# Altium footprint library DipComponent.PcbLib: 303 footprints (part 8 of 19)
Each footprint in its own frame and in the unit in brackets; x right, y up, seen from the top. Pads: shape width x height; smd on the part's side, far side on the other; paste and mask are expansions set on the pad; w line width, h text height; cw(c..) or ccw(c..) is an arc to the next point about the centre after c.
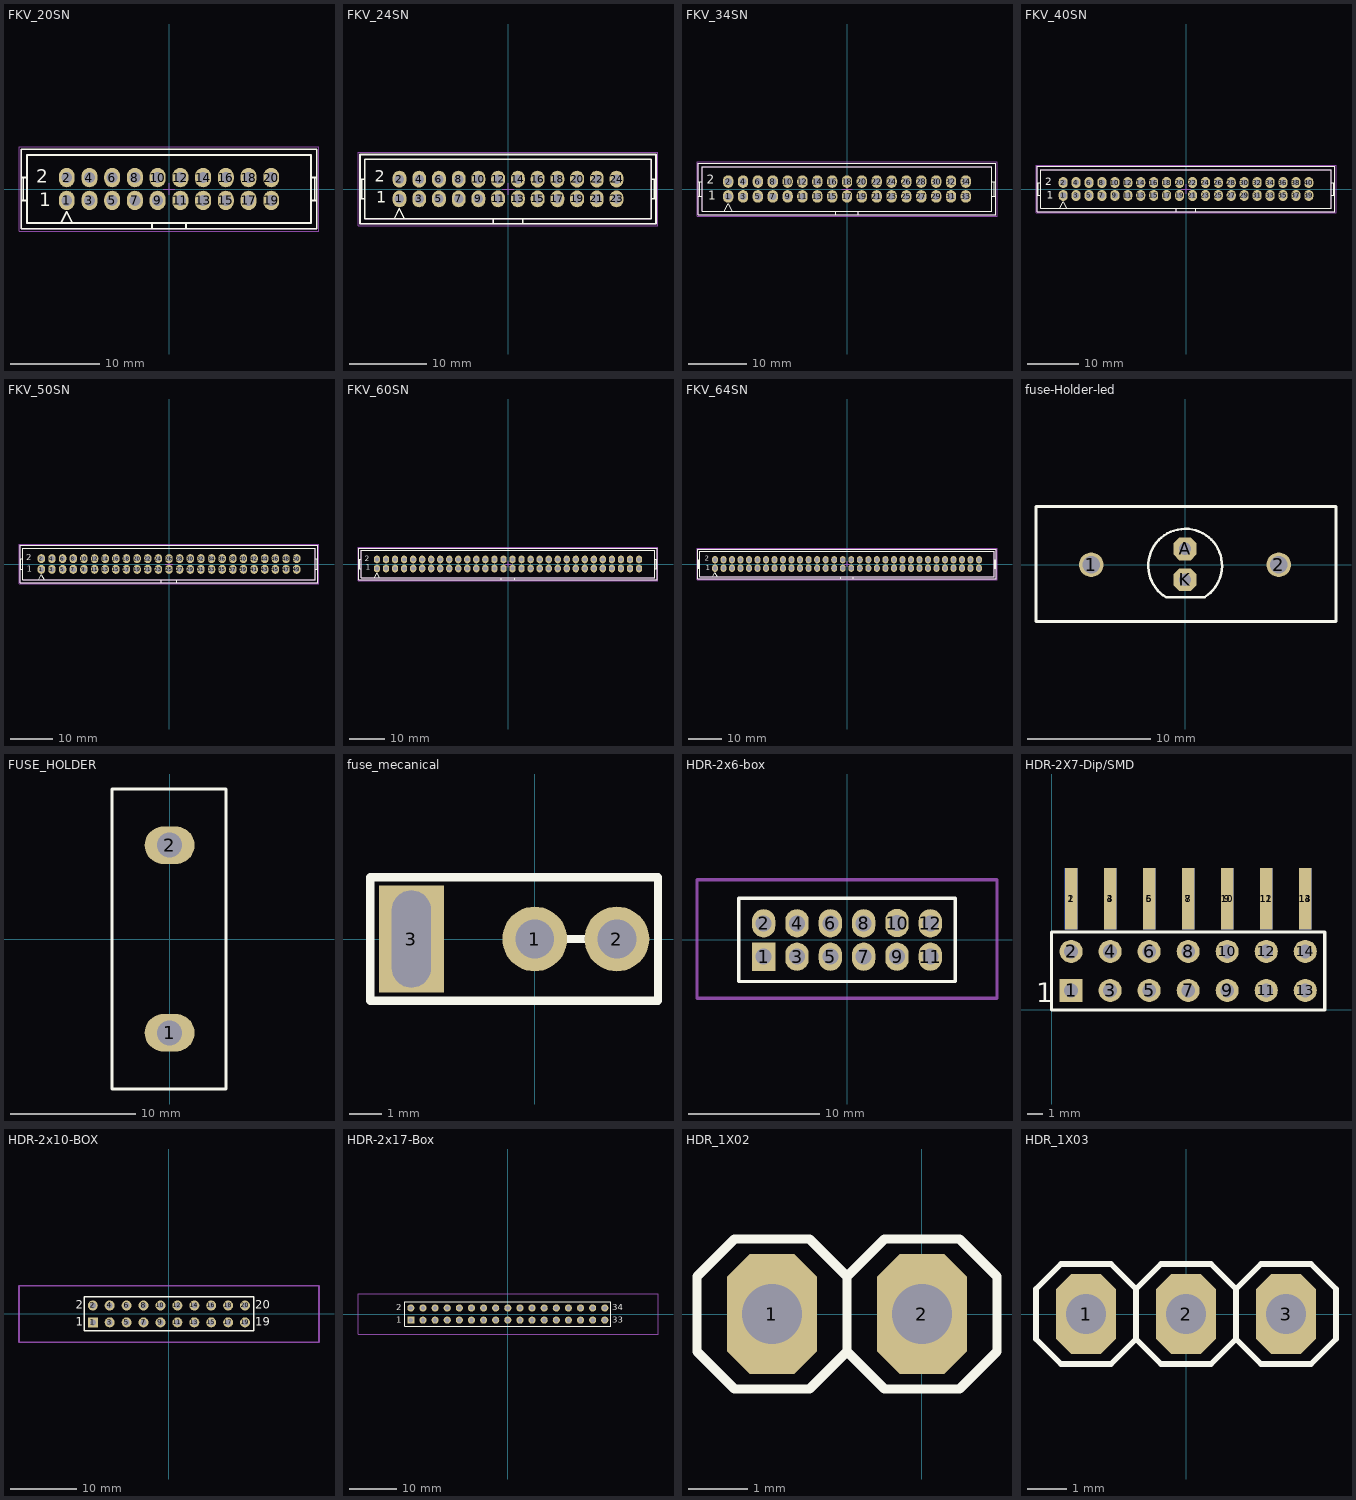
[diagram p7: the footprints below, top view; thin cyan lines are the x and y axes]

## FKV_20SN [mil] "Connector; BoxHeader; 10x2 Position ,2.54mm Pitch"
height 346.46
pads (20):
  oval 70x85 hole 48: 1(-450,-50) 2(-450,50) 3(-350,-50) 4(-350,50) 5(-250,-50) 6(-250,50) 7(-150,-50) 8(-150,50) 9(-50,-50) 10(-50,50) 11(50,-50) 12(50,50) 13(150,-50) 14(150,50) 15(250,-50) 16(250,50) 17(350,-50) 18(350,50) 19(450,-50) 20(450,50)
Top Overlay:
  lines w8: -650,-50 -625,-50 ; -650,50 -625,50 ; -641.67,-50 -641.67,50 ; -475,-150 -450,-100 -425,-150 ; -75,-175 -75,-150 ; 75,-175 75,-150 ; 625,-50 650,-50 ; 625,50 650,50 ; 641.67,-50 641.67,50 ; -75,-150 -625,-150 -625,150 625,150 625,-150 75,-150 ; -75,-150 75,-150 ; -650,-175 -650,175 650,175 650,-175 -650,-175
  text "2" at -585,27 h60
  text "1" at -572,-75 h60
Mechanical 13:
  drawing of 172 lines, arcs and shapes, not listed
Mechanical 15:
  lines w3.94: -25,0 0,0 ; 0,-25 0,0 ; 0,25 0,0 ; 25,0 0,0 ; -660,-185 660,-185 660,185 -660,185 -660,-185
3D body: height 314.96, standoff -129.92, extent 337.52,37.52 362.48,62.48
3D body: height 314.96, standoff -129.92, extent 437.52,37.52 462.48,62.48
3D body: height 314.96, standoff -129.92, extent 437.52,-62.48 462.48,-37.52
3D body: height 314.96, standoff -129.92, extent 337.52,-62.48 362.48,-37.52
3D body: height 314.96, standoff -129.92, extent 137.52,37.52 162.48,62.48
3D body: height 314.96, standoff -129.92, extent 237.52,37.52 262.48,62.48
3D body: height 314.96, standoff -129.92, extent 237.52,-62.48 262.48,-37.52
3D body: height 314.96, standoff -129.92, extent 137.52,-62.48 162.48,-37.52
3D body: height 314.96, standoff -129.92, extent -62.48,37.52 -37.52,62.48
3D body: height 314.96, standoff -129.92, extent 37.52,37.52 62.48,62.48
3D body: height 314.96, standoff -129.92, extent 37.52,-62.48 62.48,-37.52
3D body: height 314.96, standoff -129.92, extent -62.48,-62.48 -37.52,-37.52
3D body: height 314.96, standoff -129.92, extent -262.48,37.52 -237.52,62.48
3D body: height 314.96, standoff -129.92, extent -162.48,37.52 -137.52,62.48
3D body: height 314.96, standoff -129.92, extent -162.48,-62.48 -137.52,-37.52
3D body: height 314.96, standoff -129.92, extent -262.48,-62.48 -237.52,-37.52
3D body: height 314.96, standoff -129.92, extent -462.48,37.52 -437.52,62.48
3D body: height 314.96, standoff -129.92, extent -362.48,37.52 -337.52,62.48
3D body: height 314.96, standoff -129.92, extent -362.48,-62.48 -337.52,-37.52
3D body: height 314.96, standoff -129.92, extent -462.48,-62.48 -437.52,-37.52
3D body: height 346.46, standoff 0, extent -649.98,-174.98 649.98,174.98
3D body: height 78.74, standoff 0, extent -624.98,-149.98 624.98,149.98
3D body: height 118.11, standoff 0, extent -74.98,-174.98 74.98,-150.02

## FKV_24SN [mil] "Connector; BoxHeader; 12x2 Position ,2.54mm Pitch"
height 346.46
pads (24):
  oval 70x85 hole 48: 1(-550,-50) 2(-550,50) 3(-450,-50) 4(-450,50) 5(-350,-50) 6(-350,50) 7(-250,-50) 8(-250,50) 9(-150,-50) 10(-150,50) 11(-50,-50) 12(-50,50) 13(50,-50) 14(50,50) 15(150,-50) 16(150,50) 17(250,-50) 18(250,50) 19(350,-50) 20(350,50) 21(450,-50) 22(450,50) 23(550,-50) 24(550,50)
Top Overlay:
  lines w8: -750,-50 -725,-50 ; -750,50 -725,50 ; -741.67,-50 -741.67,50 ; -575,-150 -550,-100 -525,-150 ; -75,-175 -75,-150 ; 75,-175 75,-150 ; 725,-50 750,-50 ; 725,50 750,50 ; 741.67,-50 741.67,50 ; -75,-150 -725,-150 -725,150 725,150 725,-150 75,-150 ; -75,-150 75,-150 ; -750,-175 -750,175 750,175 750,-175 -750,-175
  text "2" at -674,36 h60
  text "1" at -668,-70 h60
Mechanical 13:
  drawing of 204 lines, arcs and shapes, not listed
Mechanical 15:
  lines w3.94: -30,0 0,0 ; 0,-30 0,0 ; 0,30 0,0 ; 30,0 0,0 ; -760,-185 760,-185 760,185 -760,185 -760,-185
3D body: height 346.46, standoff 0, extent -749.98,-174.98 749.98,174.98
3D body: height 78.74, standoff 0, extent -724.98,-149.98 724.98,149.98
3D body: height 118.11, standoff 0, extent -74.98,-174.98 74.98,-150.02
3D body: height 314.96, standoff -129.92, extent -562.48,-62.48 -537.52,-37.52
3D body: height 314.96, standoff -129.92, extent -462.48,-62.48 -437.52,-37.52
3D body: height 314.96, standoff -129.92, extent -462.48,37.52 -437.52,62.48
3D body: height 314.96, standoff -129.92, extent -562.48,37.52 -537.52,62.48
3D body: height 314.96, standoff -129.92, extent -362.48,-62.48 -337.52,-37.52
3D body: height 314.96, standoff -129.92, extent -262.48,-62.48 -237.52,-37.52
3D body: height 314.96, standoff -129.92, extent -262.48,37.52 -237.52,62.48
3D body: height 314.96, standoff -129.92, extent -362.48,37.52 -337.52,62.48
3D body: height 314.96, standoff -129.92, extent -162.48,-62.48 -137.52,-37.52
3D body: height 314.96, standoff -129.92, extent -62.48,-62.48 -37.52,-37.52
3D body: height 314.96, standoff -129.92, extent -62.48,37.52 -37.52,62.48
3D body: height 314.96, standoff -129.92, extent -162.48,37.52 -137.52,62.48
3D body: height 314.96, standoff -129.92, extent 37.52,-62.48 62.48,-37.52
3D body: height 314.96, standoff -129.92, extent 137.52,-62.48 162.48,-37.52
3D body: height 314.96, standoff -129.92, extent 137.52,37.52 162.48,62.48
3D body: height 314.96, standoff -129.92, extent 37.52,37.52 62.48,62.48
3D body: height 314.96, standoff -129.92, extent 237.52,-62.48 262.48,-37.52
3D body: height 314.96, standoff -129.92, extent 337.52,-62.48 362.48,-37.52
3D body: height 314.96, standoff -129.92, extent 337.52,37.52 362.48,62.48
3D body: height 314.96, standoff -129.92, extent 237.52,37.52 262.48,62.48
3D body: height 314.96, standoff -129.92, extent 437.52,-62.48 462.48,-37.52
3D body: height 314.96, standoff -129.92, extent 537.52,-62.48 562.48,-37.52
3D body: height 314.96, standoff -129.92, extent 537.52,37.52 562.48,62.48
3D body: height 314.96, standoff -129.92, extent 437.52,37.52 462.48,62.48

## FKV_34SN [mil] "Connector; BoxHeader; 17x2 Position ,2.54mm Pitch"
height 346.46
pads (34):
  oval 70x85 hole 48: 1(-800,-50) 2(-800,50) 3(-700,-50) 4(-700,50) 5(-600,-50) 6(-600,50) 7(-500,-50) 8(-500,50) 9(-400,-50) 10(-400,50) 11(-300,-50) 12(-300,50) 13(-200,-50) 14(-200,50) 15(-100,-50) 16(-100,50) 17(0,-50) 18(0,50) 19(100,-50) 20(100,50) 21(200,-50) 22(200,50) 23(300,-50) 24(300,50) 25(400,-50) 26(400,50) 27(500,-50) 28(500,50) 29(600,-50) 30(600,50) 31(700,-50) 32(700,50) 33(800,-50) 34(800,50)
Top Overlay:
  lines w8: -1000,-50 -975,-50 ; -1000,50 -975,50 ; -991.67,-50 -991.67,50 ; -825,-150 -800,-100 -775,-150 ; -75,-175 -75,-150 ; 75,-175 75,-150 ; 975,-50 1000,-50 ; 975,50 1000,50 ; 991.67,-50 991.67,50 ; -75,-150 75,-150 ; -75,-150 -975,-150 -975,150 975,150 975,-150 75,-150 ; -1000,-175 1000,-175 1000,175 -1000,175 -1000,-175
  text "1" at -934,-74 h60
  text "2" at -945,37 h60
Mechanical 13:
  drawing of 284 lines, arcs and shapes, not listed
Mechanical 15:
  lines w3.94: -35,0 0,0 ; 0,-35 0,0 ; 0,35 0,0 ; 35,0 0,0 ; -1010,-185 1010,-185 1010,185 -1010,185 -1010,-185
3D body: height 314.96, standoff -129.92, extent 787.52,37.52 812.48,62.48
3D body: height 314.96, standoff -129.92, extent 787.52,-62.48 812.48,-37.52
3D body: height 314.96, standoff -129.92, extent 587.52,37.52 612.48,62.48
3D body: height 314.96, standoff -129.92, extent 687.52,37.52 712.48,62.48
3D body: height 314.96, standoff -129.92, extent 687.52,-62.48 712.48,-37.52
3D body: height 314.96, standoff -129.92, extent 587.52,-62.48 612.48,-37.52
3D body: height 314.96, standoff -129.92, extent 387.52,37.52 412.48,62.48
3D body: height 314.96, standoff -129.92, extent 487.52,37.52 512.48,62.48
3D body: height 314.96, standoff -129.92, extent 487.52,-62.48 512.48,-37.52
3D body: height 314.96, standoff -129.92, extent 387.52,-62.48 412.48,-37.52
3D body: height 314.96, standoff -129.92, extent 187.52,37.52 212.48,62.48
3D body: height 314.96, standoff -129.92, extent 287.52,37.52 312.48,62.48
3D body: height 314.96, standoff -129.92, extent 287.52,-62.48 312.48,-37.52
3D body: height 314.96, standoff -129.92, extent 187.52,-62.48 212.48,-37.52
3D body: height 314.96, standoff -129.92, extent -12.48,37.52 12.48,62.48
3D body: height 314.96, standoff -129.92, extent 87.52,37.52 112.48,62.48
3D body: height 314.96, standoff -129.92, extent 87.52,-62.48 112.48,-37.52
3D body: height 314.96, standoff -129.92, extent -12.48,-62.48 12.48,-37.52
3D body: height 314.96, standoff -129.92, extent -212.48,37.52 -187.52,62.48
3D body: height 314.96, standoff -129.92, extent -112.48,37.52 -87.52,62.48
3D body: height 314.96, standoff -129.92, extent -112.48,-62.48 -87.52,-37.52
3D body: height 314.96, standoff -129.92, extent -212.48,-62.48 -187.52,-37.52
3D body: height 314.96, standoff -129.92, extent -412.48,37.52 -387.52,62.48
3D body: height 314.96, standoff -129.92, extent -312.48,37.52 -287.52,62.48
3D body: height 314.96, standoff -129.92, extent -312.48,-62.48 -287.52,-37.52
3D body: height 314.96, standoff -129.92, extent -412.48,-62.48 -387.52,-37.52
3D body: height 314.96, standoff -129.92, extent -612.48,37.52 -587.52,62.48
3D body: height 314.96, standoff -129.92, extent -512.48,37.52 -487.52,62.48
3D body: height 314.96, standoff -129.92, extent -512.48,-62.48 -487.52,-37.52
3D body: height 314.96, standoff -129.92, extent -612.48,-62.48 -587.52,-37.52
3D body: height 314.96, standoff -129.92, extent -812.48,37.52 -787.52,62.48
3D body: height 314.96, standoff -129.92, extent -712.48,37.52 -687.52,62.48
3D body: height 314.96, standoff -129.92, extent -712.48,-62.48 -687.52,-37.52
3D body: height 314.96, standoff -129.92, extent -812.48,-62.48 -787.52,-37.52
3D body: height 118.11, standoff 0, extent -74.98,-174.98 74.98,-150.02
3D body: height 78.74, standoff 0, extent -974.98,-149.98 974.98,149.98
3D body: height 346.46, standoff 0, extent -999.98,-174.98 999.98,174.98

## FKV_40SN [mil] "Connector; BoxHeader; 20x2 Position ,2.54mm Pitch"
height 346.46
pads (40):
  oval 70x85 hole 48: 1(-950,-50) 2(-950,50) 3(-850,-50) 4(-850,50) 5(-750,-50) 6(-750,50) 7(-650,-50) 8(-650,50) 9(-550,-50) 10(-550,50) 11(-450,-50) 12(-450,50) 13(-350,-50) 14(-350,50) 15(-250,-50) 16(-250,50) 17(-150,-50) 18(-150,50) 19(-50,-50) 20(-50,50) 21(50,-50) 22(50,50) 23(150,-50) 24(150,50) 25(250,-50) 26(250,50) 27(350,-50) 28(350,50) 29(450,-50) 30(450,50) 31(550,-50) 32(550,50) 33(650,-50) 34(650,50) 35(750,-50) 36(750,50) 37(850,-50) 38(850,50) 39(950,-50) 40(950,50)
Top Overlay:
  lines w8: -1150,-50 -1125,-50 ; -1150,50 -1125,50 ; -1141.67,-50 -1141.67,50 ; -975,-150 -950,-100 -925,-150 ; -75,-175 -75,-150 ; 75,-175 75,-150 ; 1125,-50 1150,-50 ; 1125,50 1150,50 ; 1141.67,-50 1141.67,50 ; -75,-150 -1125,-150 -1125,150 1125,150 1125,-150 75,-150 ; -75,-150 75,-150 ; -1150,-175 -1150,175 1150,175 1150,-175 -1150,-175
  text "1" at -1078,-75 h60
  text "2" at -1087,29 h60
Mechanical 13:
  drawing of 332 lines, arcs and shapes, not listed
Mechanical 15:
  lines w3.94: -35,0 0,0 ; 0,-35 0,0 ; 0,35 0,0 ; 35,0 0,0 ; -1160,-185 1160,-185 1160,185 -1160,185 -1160,-185
3D body: height 118.11, standoff 0, extent -74.98,-174.98 74.98,-150.02
3D body: height 78.74, standoff 0, extent -1124.98,-149.98 1124.98,149.98
3D body: height 346.46, standoff 0, extent -1149.98,-174.98 1149.98,174.98
3D body: height 314.96, standoff -129.92, extent -562.48,37.52 -537.52,62.48
3D body: height 314.96, standoff -129.92, extent -562.48,-62.48 -537.52,-37.52
3D body: height 314.96, standoff -129.92, extent -762.48,37.52 -737.52,62.48
3D body: height 314.96, standoff -129.92, extent -662.48,37.52 -637.52,62.48
3D body: height 314.96, standoff -129.92, extent -662.48,-62.48 -637.52,-37.52
3D body: height 314.96, standoff -129.92, extent -762.48,-62.48 -737.52,-37.52
3D body: height 314.96, standoff -129.92, extent -962.48,37.52 -937.52,62.48
3D body: height 314.96, standoff -129.92, extent -862.48,37.52 -837.52,62.48
3D body: height 314.96, standoff -129.92, extent -862.48,-62.48 -837.52,-37.52
3D body: height 314.96, standoff -129.92, extent -962.48,-62.48 -937.52,-37.52
3D body: height 314.96, standoff -129.92, extent -62.48,37.52 -37.52,62.48
3D body: height 314.96, standoff -129.92, extent -62.48,-62.48 -37.52,-37.52
3D body: height 314.96, standoff -129.92, extent -262.48,37.52 -237.52,62.48
3D body: height 314.96, standoff -129.92, extent -162.48,37.52 -137.52,62.48
3D body: height 314.96, standoff -129.92, extent -162.48,-62.48 -137.52,-37.52
3D body: height 314.96, standoff -129.92, extent -262.48,-62.48 -237.52,-37.52
3D body: height 314.96, standoff -129.92, extent -462.48,37.52 -437.52,62.48
3D body: height 314.96, standoff -129.92, extent -362.48,37.52 -337.52,62.48
3D body: height 314.96, standoff -129.92, extent -362.48,-62.48 -337.52,-37.52
3D body: height 314.96, standoff -129.92, extent -462.48,-62.48 -437.52,-37.52
3D body: height 314.96, standoff -129.92, extent 437.52,37.52 462.48,62.48
3D body: height 314.96, standoff -129.92, extent 437.52,-62.48 462.48,-37.52
3D body: height 314.96, standoff -129.92, extent 237.52,37.52 262.48,62.48
3D body: height 314.96, standoff -129.92, extent 337.52,37.52 362.48,62.48
3D body: height 314.96, standoff -129.92, extent 337.52,-62.48 362.48,-37.52
3D body: height 314.96, standoff -129.92, extent 237.52,-62.48 262.48,-37.52
3D body: height 314.96, standoff -129.92, extent 37.52,37.52 62.48,62.48
3D body: height 314.96, standoff -129.92, extent 137.52,37.52 162.48,62.48
3D body: height 314.96, standoff -129.92, extent 137.52,-62.48 162.48,-37.52
3D body: height 314.96, standoff -129.92, extent 37.52,-62.48 62.48,-37.52
3D body: height 314.96, standoff -129.92, extent 937.52,37.52 962.48,62.48
3D body: height 314.96, standoff -129.92, extent 937.52,-62.48 962.48,-37.52
3D body: height 314.96, standoff -129.92, extent 737.52,37.52 762.48,62.48
3D body: height 314.96, standoff -129.92, extent 837.52,37.52 862.48,62.48
3D body: height 314.96, standoff -129.92, extent 837.52,-62.48 862.48,-37.52
3D body: height 314.96, standoff -129.92, extent 737.52,-62.48 762.48,-37.52
3D body: height 314.96, standoff -129.92, extent 537.52,37.52 562.48,62.48
3D body: height 314.96, standoff -129.92, extent 637.52,37.52 662.48,62.48
3D body: height 314.96, standoff -129.92, extent 637.52,-62.48 662.48,-37.52
3D body: height 314.96, standoff -129.92, extent 537.52,-62.48 562.48,-37.52

## FKV_50SN [mil] "Connector; BoxHeader; 25x2 Position ,2.54mm Pitch"
height 346.46
pads (50):
  oval 70x85 hole 48: 1(-1200,-50) 2(-1200,50) 3(-1100,-50) 4(-1100,50) 5(-1000,-50) 6(-1000,50) 7(-900,-50) 8(-900,50) 9(-800,-50) 10(-800,50) 11(-700,-50) 12(-700,50) 13(-600,-50) 14(-600,50) 15(-500,-50) 16(-500,50) 17(-400,-50) 18(-400,50) 19(-300,-50) 20(-300,50) 21(-200,-50) 22(-200,50) 23(-100,-50) 24(-100,50) 25(0,-50) 26(0,50) 27(100,-50) 28(100,50) 29(200,-50) 30(200,50) 31(300,-50) 32(300,50) 33(400,-50) 34(400,50) 35(500,-50) 36(500,50) 37(600,-50) 38(600,50) 39(700,-50) 40(700,50) 41(800,-50) 42(800,50) 43(900,-50) 44(900,50) 45(1000,-50) 46(1000,50) 47(1100,-50) 48(1100,50) 49(1200,-50) 50(1200,50)
Top Overlay:
  lines w8: -1400,-50 -1375,-50 ; -1400,50 -1375,50 ; -1391.67,-50 -1391.67,50 ; -1225,-150 -1200,-100 -1175,-150 ; -75,-175 -75,-150 ; 75,-175 75,-150 ; 1375,-50 1400,-50 ; 1375,50 1400,50 ; 1391.67,-50 1391.67,50 ; -75,-150 -1375,-150 -1375,150 1375,150 1375,-150 75,-150 ; -75,-150 75,-150 ; -1400,-175 -1400,175 1400,175 1400,-175 -1400,-175
  text "1" at -1335,-71 h60
  text "2" at -1343,34 h60
Mechanical 13:
  drawing of 412 lines, arcs and shapes, not listed
Mechanical 15:
  lines w3.94: -35,0 0,0 ; 0,-35 0,0 ; 0,35 0,0 ; 35,0 0,0 ; -1410,-185 1410,-185 1410,185 -1410,185 -1410,-185
3D body: height 314.96, standoff -129.92, extent 1187.52,37.52 1212.48,62.48
3D body: height 314.96, standoff -129.92, extent 1187.52,-62.48 1212.48,-37.52
3D body: height 314.96, standoff -129.92, extent 987.52,37.52 1012.48,62.48
3D body: height 314.96, standoff -129.92, extent 1087.52,37.52 1112.48,62.48
3D body: height 314.96, standoff -129.92, extent 1087.52,-62.48 1112.48,-37.52
3D body: height 314.96, standoff -129.92, extent 987.52,-62.48 1012.48,-37.52
3D body: height 314.96, standoff -129.92, extent 787.52,37.52 812.48,62.48
3D body: height 314.96, standoff -129.92, extent 887.52,37.52 912.48,62.48
3D body: height 314.96, standoff -129.92, extent 887.52,-62.48 912.48,-37.52
3D body: height 314.96, standoff -129.92, extent 787.52,-62.48 812.48,-37.52
3D body: height 314.96, standoff -129.92, extent 687.52,37.52 712.48,62.48
3D body: height 314.96, standoff -129.92, extent 687.52,-62.48 712.48,-37.52
3D body: height 314.96, standoff -129.92, extent 487.52,37.52 512.48,62.48
3D body: height 314.96, standoff -129.92, extent 587.52,37.52 612.48,62.48
3D body: height 314.96, standoff -129.92, extent 587.52,-62.48 612.48,-37.52
3D body: height 314.96, standoff -129.92, extent 487.52,-62.48 512.48,-37.52
3D body: height 314.96, standoff -129.92, extent 287.52,37.52 312.48,62.48
3D body: height 314.96, standoff -129.92, extent 387.52,37.52 412.48,62.48
3D body: height 314.96, standoff -129.92, extent 387.52,-62.48 412.48,-37.52
3D body: height 314.96, standoff -129.92, extent 287.52,-62.48 312.48,-37.52
3D body: height 314.96, standoff -129.92, extent 187.52,37.52 212.48,62.48
3D body: height 314.96, standoff -129.92, extent 187.52,-62.48 212.48,-37.52
3D body: height 314.96, standoff -129.92, extent -12.48,37.52 12.48,62.48
3D body: height 314.96, standoff -129.92, extent 87.52,37.52 112.48,62.48
3D body: height 314.96, standoff -129.92, extent 87.52,-62.48 112.48,-37.52
3D body: height 314.96, standoff -129.92, extent -12.48,-62.48 12.48,-37.52
3D body: height 314.96, standoff -129.92, extent -212.48,37.52 -187.52,62.48
3D body: height 314.96, standoff -129.92, extent -112.48,37.52 -87.52,62.48
3D body: height 314.96, standoff -129.92, extent -112.48,-62.48 -87.52,-37.52
3D body: height 314.96, standoff -129.92, extent -212.48,-62.48 -187.52,-37.52
3D body: height 314.96, standoff -129.92, extent -312.48,37.52 -287.52,62.48
3D body: height 314.96, standoff -129.92, extent -312.48,-62.48 -287.52,-37.52
3D body: height 314.96, standoff -129.92, extent -512.48,37.52 -487.52,62.48
3D body: height 314.96, standoff -129.92, extent -412.48,37.52 -387.52,62.48
3D body: height 314.96, standoff -129.92, extent -412.48,-62.48 -387.52,-37.52
3D body: height 314.96, standoff -129.92, extent -512.48,-62.48 -487.52,-37.52
3D body: height 314.96, standoff -129.92, extent -712.48,37.52 -687.52,62.48
3D body: height 314.96, standoff -129.92, extent -612.48,37.52 -587.52,62.48
3D body: height 314.96, standoff -129.92, extent -612.48,-62.48 -587.52,-37.52
3D body: height 314.96, standoff -129.92, extent -712.48,-62.48 -687.52,-37.52
3D body: height 314.96, standoff -129.92, extent -812.48,37.52 -787.52,62.48
3D body: height 314.96, standoff -129.92, extent -812.48,-62.48 -787.52,-37.52
3D body: height 314.96, standoff -129.92, extent -1012.48,37.52 -987.52,62.48
3D body: height 314.96, standoff -129.92, extent -912.48,37.52 -887.52,62.48
3D body: height 314.96, standoff -129.92, extent -912.48,-62.48 -887.52,-37.52
3D body: height 314.96, standoff -129.92, extent -1012.48,-62.48 -987.52,-37.52
3D body: height 314.96, standoff -129.92, extent -1212.48,37.52 -1187.52,62.48
3D body: height 314.96, standoff -129.92, extent -1112.48,37.52 -1087.52,62.48
3D body: height 314.96, standoff -129.92, extent -1112.48,-62.48 -1087.52,-37.52
3D body: height 314.96, standoff -129.92, extent -1212.48,-62.48 -1187.52,-37.52
3D body: height 346.46, standoff 0, extent -1399.98,-174.98 1399.98,174.98
3D body: height 78.74, standoff 0, extent -1374.98,-149.98 1374.98,149.98
3D body: height 118.11, standoff 0, extent -74.98,-174.98 74.98,-150.02

## FKV_60SN [mil] "Connector; BoxHeader; 30x2 Position ,2.54mm Pitch"
height 346.46
pads (60):
  oval 70x85 hole 48: 1(-1450,-50) 2(-1450,50) 3(-1350,-50) 4(-1350,50) 5(-1250,-50) 6(-1250,50) 7(-1150,-50) 8(-1150,50) 9(-1050,-50) 10(-1050,50) 11(-950,-50) 12(-950,50) 13(-850,-50) 14(-850,50) 15(-750,-50) 16(-750,50) 17(-650,-50) 18(-650,50) 19(-550,-50) 20(-550,50) 21(-450,-50) 22(-450,50) 23(-350,-50) 24(-350,50) 25(-250,-50) 26(-250,50) 27(-150,-50) 28(-150,50) 29(-50,-50) 30(-50,50) 31(50,-50) 32(50,50) 33(150,-50) 34(150,50) 35(250,-50) 36(250,50) 37(350,-50) 38(350,50) 39(450,-50) 40(450,50) 41(550,-50) 42(550,50) 43(650,-50) 44(650,50) 45(750,-50) 46(750,50) 47(850,-50) 48(850,50) 49(950,-50) 50(950,50) 51(1050,-50) 52(1050,50) 53(1150,-50) 54(1150,50) 55(1250,-50) 56(1250,50) 57(1350,-50) 58(1350,50) 59(1450,-50) 60(1450,50)
Top Overlay:
  lines w8: -1650,-50 -1625,-50 ; -1650,50 -1625,50 ; -1641.67,-50 -1641.67,50 ; -1475,-150 -1450,-100 -1425,-150 ; -75,-175 -75,-150 ; 75,-175 75,-150 ; 1625,-50 1650,-50 ; 1625,50 1650,50 ; 1641.67,-50 1641.67,50 ; -75,-150 75,-150 ; -75,-150 -1625,-150 -1625,150 1625,150 1625,-150 75,-150 ; -1650,-175 1650,-175 1650,175 -1650,175 -1650,-175
  text "1" at -1576,-66 h60
  text "2" at -1585,32 h60
Mechanical 13:
  drawing of 492 lines, arcs and shapes, not listed
Mechanical 15:
  lines w3.94: -35,0 0,0 ; 0,-35 0,0 ; 0,35 0,0 ; 35,0 0,0 ; -1660,-185 -1660,185 1660,185 1660,-185 -1660,-185
3D body: height 314.96, standoff -129.92, extent 1037.52,-62.48 1062.48,-37.52
3D body: height 314.96, standoff -129.92, extent 1137.52,-62.48 1162.48,-37.52
3D body: height 314.96, standoff -129.92, extent 1137.52,37.52 1162.48,62.48
3D body: height 314.96, standoff -129.92, extent 1037.52,37.52 1062.48,62.48
3D body: height 314.96, standoff -129.92, extent 1237.52,-62.48 1262.48,-37.52
3D body: height 314.96, standoff -129.92, extent 1337.52,-62.48 1362.48,-37.52
3D body: height 314.96, standoff -129.92, extent 1337.52,37.52 1362.48,62.48
3D body: height 314.96, standoff -129.92, extent 1237.52,37.52 1262.48,62.48
3D body: height 314.96, standoff -129.92, extent 1437.52,-62.48 1462.48,-37.52
3D body: height 314.96, standoff -129.92, extent 1437.52,37.52 1462.48,62.48
3D body: height 314.96, standoff -129.92, extent 537.52,-62.48 562.48,-37.52
3D body: height 314.96, standoff -129.92, extent 637.52,-62.48 662.48,-37.52
3D body: height 314.96, standoff -129.92, extent 637.52,37.52 662.48,62.48
3D body: height 314.96, standoff -129.92, extent 537.52,37.52 562.48,62.48
3D body: height 314.96, standoff -129.92, extent 737.52,-62.48 762.48,-37.52
3D body: height 314.96, standoff -129.92, extent 837.52,-62.48 862.48,-37.52
3D body: height 314.96, standoff -129.92, extent 837.52,37.52 862.48,62.48
3D body: height 314.96, standoff -129.92, extent 737.52,37.52 762.48,62.48
3D body: height 314.96, standoff -129.92, extent 937.52,-62.48 962.48,-37.52
3D body: height 314.96, standoff -129.92, extent 937.52,37.52 962.48,62.48
3D body: height 314.96, standoff -129.92, extent 37.52,-62.48 62.48,-37.52
3D body: height 314.96, standoff -129.92, extent 137.52,-62.48 162.48,-37.52
3D body: height 314.96, standoff -129.92, extent 137.52,37.52 162.48,62.48
3D body: height 314.96, standoff -129.92, extent 37.52,37.52 62.48,62.48
3D body: height 314.96, standoff -129.92, extent 237.52,-62.48 262.48,-37.52
3D body: height 314.96, standoff -129.92, extent 337.52,-62.48 362.48,-37.52
3D body: height 314.96, standoff -129.92, extent 337.52,37.52 362.48,62.48
3D body: height 314.96, standoff -129.92, extent 237.52,37.52 262.48,62.48
3D body: height 314.96, standoff -129.92, extent 437.52,-62.48 462.48,-37.52
3D body: height 314.96, standoff -129.92, extent 437.52,37.52 462.48,62.48
3D body: height 314.96, standoff -129.92, extent -462.48,-62.48 -437.52,-37.52
3D body: height 314.96, standoff -129.92, extent -362.48,-62.48 -337.52,-37.52
3D body: height 314.96, standoff -129.92, extent -362.48,37.52 -337.52,62.48
3D body: height 314.96, standoff -129.92, extent -462.48,37.52 -437.52,62.48
3D body: height 314.96, standoff -129.92, extent -262.48,-62.48 -237.52,-37.52
3D body: height 314.96, standoff -129.92, extent -162.48,-62.48 -137.52,-37.52
3D body: height 314.96, standoff -129.92, extent -162.48,37.52 -137.52,62.48
3D body: height 314.96, standoff -129.92, extent -262.48,37.52 -237.52,62.48
3D body: height 314.96, standoff -129.92, extent -62.48,-62.48 -37.52,-37.52
3D body: height 314.96, standoff -129.92, extent -62.48,37.52 -37.52,62.48
3D body: height 314.96, standoff -129.92, extent -962.48,-62.48 -937.52,-37.52
3D body: height 314.96, standoff -129.92, extent -862.48,-62.48 -837.52,-37.52
3D body: height 314.96, standoff -129.92, extent -862.48,37.52 -837.52,62.48
3D body: height 314.96, standoff -129.92, extent -962.48,37.52 -937.52,62.48
3D body: height 314.96, standoff -129.92, extent -762.48,-62.48 -737.52,-37.52
3D body: height 314.96, standoff -129.92, extent -662.48,-62.48 -637.52,-37.52
3D body: height 314.96, standoff -129.92, extent -662.48,37.52 -637.52,62.48
3D body: height 314.96, standoff -129.92, extent -762.48,37.52 -737.52,62.48
3D body: height 314.96, standoff -129.92, extent -562.48,-62.48 -537.52,-37.52
3D body: height 314.96, standoff -129.92, extent -562.48,37.52 -537.52,62.48
3D body: height 314.96, standoff -129.92, extent -1462.48,-62.48 -1437.52,-37.52
3D body: height 314.96, standoff -129.92, extent -1362.48,-62.48 -1337.52,-37.52
3D body: height 314.96, standoff -129.92, extent -1362.48,37.52 -1337.52,62.48
3D body: height 314.96, standoff -129.92, extent -1462.48,37.52 -1437.52,62.48
3D body: height 314.96, standoff -129.92, extent -1262.48,-62.48 -1237.52,-37.52
3D body: height 314.96, standoff -129.92, extent -1162.48,-62.48 -1137.52,-37.52
3D body: height 314.96, standoff -129.92, extent -1162.48,37.52 -1137.52,62.48
3D body: height 314.96, standoff -129.92, extent -1262.48,37.52 -1237.52,62.48
3D body: height 314.96, standoff -129.92, extent -1062.48,-62.48 -1037.52,-37.52
3D body: height 314.96, standoff -129.92, extent -1062.48,37.52 -1037.52,62.48
3D body: height 346.46, standoff 0, extent -1649.98,-174.98 1649.98,174.98
3D body: height 78.74, standoff 0, extent -1624.98,-149.98 1624.98,149.98
3D body: height 118.11, standoff 0, extent -74.98,-174.98 74.98,-150.02

## FKV_64SN [mil] "Connector; BoxHeader; 32x2 Position ,2.54mm Pitch"
height 346.46
pads (64):
  oval 70x85 hole 48: 1(-1550,-50) 2(-1550,50) 3(-1450,-50) 4(-1450,50) 5(-1350,-50) 6(-1350,50) 7(-1250,-50) 8(-1250,50) 9(-1150,-50) 10(-1150,50) 11(-1050,-50) 12(-1050,50) 13(-950,-50) 14(-950,50) 15(-850,-50) 16(-850,50) 17(-750,-50) 18(-750,50) 19(-650,-50) 20(-650,50) 21(-550,-50) 22(-550,50) 23(-450,-50) 24(-450,50) 25(-350,-50) 26(-350,50) 27(-250,-50) 28(-250,50) 29(-150,-50) 30(-150,50) 31(-50,-50) 32(-50,50) 33(50,-50) 34(50,50) 35(150,-50) 36(150,50) 37(250,-50) 38(250,50) 39(350,-50) 40(350,50) 41(450,-50) 42(450,50) 43(550,-50) 44(550,50) 45(650,-50) 46(650,50) 47(750,-50) 48(750,50) 49(850,-50) 50(850,50) 51(950,-50) 52(950,50) 53(1050,-50) 54(1050,50) 55(1150,-50) 56(1150,50) 57(1250,-50) 58(1250,50) 59(1350,-50) 60(1350,50) 61(1450,-50) 62(1450,50) 63(1550,-50) 64(1550,50)
Top Overlay:
  lines w8: -1750,-50 -1725,-50 ; -1750,50 -1725,50 ; -1741.67,-50 -1741.67,50 ; -1575,-150 -1550,-100 -1525,-150 ; -75,-175 -75,-150 ; 75,-175 75,-150 ; 1725,-50 1750,-50 ; 1725,50 1750,50 ; 1741.67,-50 1741.67,50 ; -75,-150 -1725,-150 -1725,150 1725,150 1725,-150 75,-150 ; -75,-150 75,-150 ; -1750,-175 -1750,175 1750,175 1750,-175 -1750,-175
  text "2" at -1669,41 h60
  text "1" at -1660,-76 h60
Mechanical 13:
  drawing of 524 lines, arcs and shapes, not listed
Mechanical 15:
  lines w3.94: -30,0 0,0 ; 0,-30 0,0 ; 0,30 0,0 ; 30,0 0,0 ; -1760,-185 1760,-185 1760,185 -1760,185 -1760,-185
3D body: height 118.11, standoff 0, extent -74.98,-174.98 74.98,-150.02
3D body: height 78.74, standoff 0, extent -1724.98,-149.98 1724.98,149.98
3D body: height 346.46, standoff 0, extent -1749.98,-174.98 1749.98,174.98
3D body: height 314.96, standoff -129.92, extent -1562.48,-62.48 -1537.52,-37.52
3D body: height 314.96, standoff -129.92, extent -1462.48,-62.48 -1437.52,-37.52
3D body: height 314.96, standoff -129.92, extent -1462.48,37.52 -1437.52,62.48
3D body: height 314.96, standoff -129.92, extent -1562.48,37.52 -1537.52,62.48
3D body: height 314.96, standoff -129.92, extent -1362.48,-62.48 -1337.52,-37.52
3D body: height 314.96, standoff -129.92, extent -1262.48,-62.48 -1237.52,-37.52
3D body: height 314.96, standoff -129.92, extent -1262.48,37.52 -1237.52,62.48
3D body: height 314.96, standoff -129.92, extent -1362.48,37.52 -1337.52,62.48
3D body: height 314.96, standoff -129.92, extent -1162.48,-62.48 -1137.52,-37.52
3D body: height 314.96, standoff -129.92, extent -1062.48,-62.48 -1037.52,-37.52
3D body: height 314.96, standoff -129.92, extent -1062.48,37.52 -1037.52,62.48
3D body: height 314.96, standoff -129.92, extent -1162.48,37.52 -1137.52,62.48
3D body: height 314.96, standoff -129.92, extent -962.48,-62.48 -937.52,-37.52
3D body: height 314.96, standoff -129.92, extent -862.48,-62.48 -837.52,-37.52
3D body: height 314.96, standoff -129.92, extent -862.48,37.52 -837.52,62.48
3D body: height 314.96, standoff -129.92, extent -962.48,37.52 -937.52,62.48
3D body: height 314.96, standoff -129.92, extent -762.48,-62.48 -737.52,-37.52
3D body: height 314.96, standoff -129.92, extent -662.48,-62.48 -637.52,-37.52
3D body: height 314.96, standoff -129.92, extent -662.48,37.52 -637.52,62.48
3D body: height 314.96, standoff -129.92, extent -762.48,37.52 -737.52,62.48
3D body: height 314.96, standoff -129.92, extent -562.48,-62.48 -537.52,-37.52
3D body: height 314.96, standoff -129.92, extent -462.48,-62.48 -437.52,-37.52
3D body: height 314.96, standoff -129.92, extent -462.48,37.52 -437.52,62.48
3D body: height 314.96, standoff -129.92, extent -562.48,37.52 -537.52,62.48
3D body: height 314.96, standoff -129.92, extent -362.48,-62.48 -337.52,-37.52
3D body: height 314.96, standoff -129.92, extent -262.48,-62.48 -237.52,-37.52
3D body: height 314.96, standoff -129.92, extent -262.48,37.52 -237.52,62.48
3D body: height 314.96, standoff -129.92, extent -362.48,37.52 -337.52,62.48
3D body: height 314.96, standoff -129.92, extent -162.48,-62.48 -137.52,-37.52
3D body: height 314.96, standoff -129.92, extent -62.48,-62.48 -37.52,-37.52
3D body: height 314.96, standoff -129.92, extent -62.48,37.52 -37.52,62.48
3D body: height 314.96, standoff -129.92, extent -162.48,37.52 -137.52,62.48
3D body: height 314.96, standoff -129.92, extent 37.52,-62.48 62.48,-37.52
3D body: height 314.96, standoff -129.92, extent 137.52,-62.48 162.48,-37.52
3D body: height 314.96, standoff -129.92, extent 137.52,37.52 162.48,62.48
3D body: height 314.96, standoff -129.92, extent 37.52,37.52 62.48,62.48
3D body: height 314.96, standoff -129.92, extent 237.52,-62.48 262.48,-37.52
3D body: height 314.96, standoff -129.92, extent 337.52,-62.48 362.48,-37.52
3D body: height 314.96, standoff -129.92, extent 337.52,37.52 362.48,62.48
3D body: height 314.96, standoff -129.92, extent 237.52,37.52 262.48,62.48
3D body: height 314.96, standoff -129.92, extent 437.52,-62.48 462.48,-37.52
3D body: height 314.96, standoff -129.92, extent 537.52,-62.48 562.48,-37.52
3D body: height 314.96, standoff -129.92, extent 537.52,37.52 562.48,62.48
3D body: height 314.96, standoff -129.92, extent 437.52,37.52 462.48,62.48
3D body: height 314.96, standoff -129.92, extent 637.52,-62.48 662.48,-37.52
3D body: height 314.96, standoff -129.92, extent 737.52,-62.48 762.48,-37.52
3D body: height 314.96, standoff -129.92, extent 737.52,37.52 762.48,62.48
3D body: height 314.96, standoff -129.92, extent 637.52,37.52 662.48,62.48
3D body: height 314.96, standoff -129.92, extent 837.52,-62.48 862.48,-37.52
3D body: height 314.96, standoff -129.92, extent 937.52,-62.48 962.48,-37.52
3D body: height 314.96, standoff -129.92, extent 937.52,37.52 962.48,62.48
3D body: height 314.96, standoff -129.92, extent 837.52,37.52 862.48,62.48
3D body: height 314.96, standoff -129.92, extent 1037.52,-62.48 1062.48,-37.52
3D body: height 314.96, standoff -129.92, extent 1137.52,-62.48 1162.48,-37.52
3D body: height 314.96, standoff -129.92, extent 1137.52,37.52 1162.48,62.48
3D body: height 314.96, standoff -129.92, extent 1037.52,37.52 1062.48,62.48
3D body: height 314.96, standoff -129.92, extent 1237.52,-62.48 1262.48,-37.52
3D body: height 314.96, standoff -129.92, extent 1337.52,-62.48 1362.48,-37.52
3D body: height 314.96, standoff -129.92, extent 1337.52,37.52 1362.48,62.48
3D body: height 314.96, standoff -129.92, extent 1237.52,37.52 1262.48,62.48
3D body: height 314.96, standoff -129.92, extent 1437.52,-62.48 1462.48,-37.52
3D body: height 314.96, standoff -129.92, extent 1537.52,-62.48 1562.48,-37.52
3D body: height 314.96, standoff -129.92, extent 1537.52,37.52 1562.48,62.48
3D body: height 314.96, standoff -129.92, extent 1437.52,37.52 1462.48,62.48

## fuse-Holder-led [mm] "with led"
pads (4):
  round 2 hole 1.4: 1(-7.62,0) 2(7.62,0)
  oct 1.85x1.85 hole 1: A(0,1.292) K(0,-1.208)
Top Overlay:
  lines w0.2: -1.543,-2.639 1.599,-2.621 ccw(c0.01,-0.077) -1.535,-2.648
  lines w0.254: -12.116,-4.623 12.268,-4.623 12.268,4.75 -12.116,4.75 -12.116,-4.623
3D body "Fuse-Holder.stp": height 14, standoff -3, extent -12.098,-4.648 12.302,4.752

## FUSE_HOLDER [mm]
pads (2):
  oval 4x3 hole 2: 1(0,-7.5) 2(0,7.5)
Top Overlay:
  lines w0.254: -4.6,-12 -4.6,12 4.5,12 4.5,-12 -4.6,-12
3D body "SW3dPS-part 8.STEP": height 12.96, standoff -2.9, extent -4.606,-12.031 4.476,11.969

## fuse_mecanical [mm]
pads (3):
  round 2 hole 1.2: 1(0,0) 2(2.54,0)
  rect 2x3.3 hole 1.2 slot 3 at 90 deg: 3(-3.81,0)
Top Overlay:
  lines w0.254: 0,0 2.54,0 ; -5.08,-1.905 3.81,-1.905 3.81,1.905 -5.08,1.905 -5.08,-1.905
3D body "1W right 100mil.step": height 14.83, standoff -2.23, extent -1.736,-1.905 3.006,1.895

## HDR-2x6-box [mil]
pads (12):
  rect 70x85 hole 48: 1(-250,-50.5)
  oval 70x85 hole 48: 2(-250,49.5) 3(-150,-50.5) 4(-150,49.5) 5(-50,-50.5) 6(-50,49.5) 7(50,-50.5) 8(50,49.5) 9(150,-50.5) 10(150,50.5) 11(250,-50.5) 12(250,49.5)
Top Overlay:
  lines w10: -325,-125 -325,125 325,125 325,-125 -325,-125
Mechanical 13:
  lines w3.94: -270,-70.5 -270,-30.5 -230,-30.5 -230,-70.5 -270,-70.5 ; -270,29.5 -230,29.5 -230,69.5 -270,69.5 -270,29.5 ; -170,-70.5 -130,-70.5 -130,-30.5 -170,-30.5 -170,-70.5 ; -170,29.5 -130,29.5 -130,69.5 -170,69.5 -170,29.5 ; -70,-70.5 -70,-30.5 -30,-30.5 -30,-70.5 -70,-70.5 ; -70,29.5 -30,29.5 -30,69.5 -70,69.5 -70,29.5 ; 30,-70.5 70,-70.5 70,-30.5 30,-30.5 30,-70.5 ; 30,29.5 70,29.5 70,69.5 30,69.5 30,29.5 ; 130,-70.5 130,-30.5 170,-30.5 170,-70.5 130,-70.5 ; 130,29.5 170,29.5 170,69.5 130,69.5 130,29.5 ; 230,-70.5 270,-70.5 270,-30.5 230,-30.5 230,-70.5 ; 230,29.5 270,29.5 270,69.5 230,69.5 230,29.5
Mechanical 15:
  lines w10: -450,-175 450,-175 450,180 -450,180 -450,-175
3D body "HeaderBox12.STEP": height 358.27, standoff -118.11, extent -448,-175.77 452,182.5

## HDR-2X7-Dip/SMD [mm] "Connector; Header; 7x2 Position"
pads (28):
  rect 1.5x1.5 hole 0.9: 1(1.27,1.257)
  rect 0.8x4 smd: 1(1.27,7.226) 3(3.81,7.226) 5(6.35,7.226) 7(8.89,7.226) 9(11.43,7.226) 11(13.97,7.226) 13(16.51,7.226)
  round 1.5 hole 0.9: 2(1.27,3.797) 3(3.81,1.257) 4(3.81,3.797) 5(6.35,1.257) 6(6.35,3.797) 7(8.89,1.257) 8(8.89,3.797) 9(11.43,1.257) 10(11.43,3.797) 11(13.97,1.257) 12(13.97,3.797) 13(16.51,1.257) 14(16.51,3.797)
  rect 0.8x4 smd far side: 2(1.27,7.226) 4(3.81,7.226) 6(6.35,7.226) 8(8.89,7.226) 10(11.43,7.226) 12(13.97,7.226) 14(16.51,7.226)
Top Overlay:
  lines w0.2: 0,-0.013 0,5.067 17.78,5.067 17.78,-0.013 0,-0.013
  text "1" at -1.016,0.495 h1.27

## HDR-2x10-BOX [mm]
pads (20):
  rect 1.5x1.5 hole 0.9: 1(-11.43,-1.27)
  round 1.5 hole 0.9: 2(-11.43,1.27) 3(-8.89,-1.27) 4(-8.89,1.27) 5(-6.35,-1.27) 6(-6.35,1.27) 7(-3.81,-1.27) 8(-3.81,1.27) 9(-1.27,-1.27) 10(-1.27,1.27) 11(1.27,-1.27) 12(1.27,1.27) 13(3.81,-1.27) 14(3.81,1.27) 15(6.35,-1.27) 16(6.35,1.27) 17(8.89,-1.27) 18(8.89,1.27) 19(11.43,-1.27) 20(11.43,1.27)
Top Overlay:
  lines w0.2: -12.7,-2.54 -10.795,-2.54 12.7,-2.54 12.7,2.54 -10.795,2.54 -12.7,2.54 -12.7,-2.54
  text "20" at 12.954,0.762 h1.27
  text "19" at 12.954,-1.778 h1.27
  text "1" at -13.97,-1.778 h1.27
  text "2" at -13.97,0.762 h1.27
Mechanical 15:
  lines w0.254: -22.504,-4.267 22.53,-4.267 22.53,4.242 -22.504,4.242 -22.504,-4.267
3D body "IDC2x17.stp": height 23.39, standoff -3.11, extent -22.494,-4.267 22.506,4.233

## HDR-2x17-Box [mm]
pads (34):
  rect 1.5x1.5 hole 0.9: 1(-20.32,-1.27)
  round 1.5 hole 0.9: 2(-20.32,1.27) 3(-17.78,-1.27) 4(-17.78,1.27) 5(-15.24,-1.27) 6(-15.24,1.27) 7(-12.7,-1.27) 8(-12.7,1.27) 9(-10.16,-1.27) 10(-10.16,1.27) 11(-7.62,-1.27) 12(-7.62,1.27) 13(-5.08,-1.27) 14(-5.08,1.27) 15(-2.54,-1.27) 16(-2.54,1.27) 17(0,-1.27) 18(0,1.27) 19(2.54,-1.27) 20(2.54,1.27) 21(5.08,-1.27) 22(5.08,1.27) 23(7.62,-1.27) 24(7.62,1.27) 25(10.16,-1.27) 26(10.16,1.27) 27(12.7,-1.27) 28(12.7,1.27) 29(15.24,-1.27) 30(15.24,1.27) 31(17.78,-1.27) 32(17.78,1.27) 33(20.32,-1.27) 34(20.32,1.27)
Top Overlay:
  lines w0.2: -21.59,-2.54 21.59,-2.54 21.59,2.54 -21.59,2.54 -21.59,-2.54
  text "34" at 21.844,0.762 h1.27
  text "33" at 21.844,-1.778 h1.27
  text "1" at -23.368,-1.778 h1.27
  text "2" at -23.368,0.762 h1.27
Mechanical 15:
  lines w0.254: -31.394,-4.242 -31.344,-4.242 31.471,-4.242 31.471,4.267 -31.394,4.267 -31.394,-4.242
3D body "IDC2x10.stp": height 23.39, standoff -3.11, extent -31.406,-4.275 31.394,4.225

## HDR_1X02 [mil]
pads (2):
  oct 60x80 hole 40: 1(-100,0) 2(0,0)
Top Overlay:
  rectangle: -10,-10 10,10
  rectangle: -110,-10 -90,10
  lines w6: -50,-25 -50,25 ; -50,-25 -75,-50 -125,-50 -150,-25 -150,25 -125,50 -75,50 -50,25 ; -50,-25 -25,-50 25,-50 50,-25 50,25 25,50 -25,50 -50,25
3D body "User Library-Header Vertical 2_54mm Pitch2-12 Way.STEP": height 233.86, standoff -115.75, extent -149.21,-51.18 50.79,48.82

## HDR_1X03 [mil]
pads (3):
  oct 60x80 hole 40: 1(-100,0) 2(0,0) 3(100,0)
Top Overlay:
  rectangle: 90,-10 110,10
  rectangle: -110,-10 -90,10
  rectangle: -10,-10 10,10
  lines w6: -50,-25 -25,-50 25,-50 50,-25 ; -50,-25 -75,-50 -125,-50 -150,-25 -150,25 -125,50 -75,50 -50,25 ; -50,-25 -50,25 ; -50,25 -25,50 25,50 50,25 ; 50,-25 75,-50 125,-50 150,-25 150,25 125,50 75,50 50,25 ; 50,-25 50,25
3D body "PinHeader 1X3.step": height 335.04, standoff -144.88, extent -151.97,-61.02 148.03,53.94